# Altium integrated library Samtec_2,54_mm_Pitch_Socket_Strips.IntLib: 489 symbols (part 2 of 4) (continued)
## SSM-108-L-DV-BE-K
designator J?
Tiger Claw(TM) Surface Mount Socket, Vertical, -55 to 125 degC, 2.54 mm Pitch, 16-Pin, Female, RoHS; Manufacturer: Samtec; PartNumber: SSM-108-L-DV-BE-K; Pitch: 2.54 mm; DatasheetVersion: F-214; PackageVersion: AK, 3/2000; PackageReference: SSM-108-X-DV-BE-K; PackageDescription: .100 C.L. Double Vertical SMT Socket Strip; Orientation: Vertical; RoHS: True; Temperature Range: -55 to 125 degC; Mounting Technology: Surface Mount; ComponentLink1Description: Manufacturer URL; ComponentLink1URL: http://www.samtec.com; ComponentLink2Description: Datasheet; ComponentLink2URL: http://www.samtec.com/documents/webfiles/pdf/SSM_SM.PDF; ComponentLink3Description: Package Specification; ComponentLink3URL: http://www.samtec.com/documents/webfiles/cpdf/SSM-1XX-XXX-DV-XX-XX-X-XX-MKT.pdf
footprint SMTC-SSM-108-X-DV-BE-K (C.L. Double Vertical SMT Socket Strip, 2x8 Pins, 2.54mm Pitch, Female)
pins: 1, 2, 3, 4, 5, 6, 7, 8, 9, 10, 11, 12, 13, 14, 15, 16

## SSM-108-S-DV
designator J?
Tiger Claw(TM) Surface Mount Socket, Vertical, -55 to 125 degC, 2.54 mm Pitch, 16-Pin, Female, RoHS; Manufacturer: Samtec; PartNumber: SSM-108-S-DV; Pitch: 2.54 mm; DatasheetVersion: F-214; PackageVersion: AK, 3/2000; PackageReference: SSM-108-X-DV; PackageDescription: .100 C.L. Double Vertical SMT Socket Strip; Supplier 1: Digi-Key; Supplier Part Number 1: SAM1150-08-ND; Supplier 2: Newark; Supplier Part Number 2: 11P7893; Orientation: Vertical; RoHS: True; Temperature Range: -55 to 125 degC; Mounting Technology: Surface Mount; ComponentLink1Description: Manufacturer URL; ComponentLink1URL: http://www.samtec.com; ComponentLink2Description: Datasheet; ComponentLink2URL: http://www.samtec.com/documents/webfiles/pdf/SSM_SM.PDF; ComponentLink3Description: Package Specification; ComponentLink3URL: http://www.samtec.com/documents/webfiles/cpdf/SSM-1XX-XXX-DV-XX-XX-X-XX-MKT.pdf
footprint SMTC-SSM-108-X-DV (C.L. Double Vertical SMT Socket Strip, 2x8 Pins, 2.54mm Pitch, Female)
pins: 1, 2, 3, 4, 5, 6, 7, 8, 9, 10, 11, 12, 13, 14, 15, 16

## SSM-108-S-DV-A
designator J?
Tiger Claw(TM) Surface Mount Socket, Vertical, -55 to 125 degC, 2.54 mm Pitch, 16-Pin, Female, RoHS; Manufacturer: Samtec; PartNumber: SSM-108-S-DV-A; Pitch: 2.54 mm; DatasheetVersion: F-214; PackageVersion: AK, 3/2000; PackageReference: SSM-108-X-DV-A; PackageDescription: .100 C.L. Double Vertical SMT Socket Strip; Supplier 1: Newark; Supplier Part Number 1: 81P4509; Orientation: Vertical; RoHS: True; Temperature Range: -55 to 125 degC; Mounting Technology: Surface Mount; ComponentLink1Description: Manufacturer URL; ComponentLink1URL: http://www.samtec.com; ComponentLink2Description: Datasheet; ComponentLink2URL: http://www.samtec.com/documents/webfiles/pdf/SSM_SM.PDF; ComponentLink3Description: Package Specification; ComponentLink3URL: http://www.samtec.com/documents/webfiles/cpdf/SSM-1XX-XXX-DV-XX-XX-X-XX-MKT.pdf
footprint SMTC-SSM-108-X-DV-A (C.L. Double Vertical SMT Socket Strip, 2x8 Pins, 2.54mm Pitch, Female)
pins: 1, 2, 3, 4, 5, 6, 7, 8, 9, 10, 11, 12, 13, 14, 15, 16

## SSM-108-S-DV-BE-K
designator J?
Tiger Claw(TM) Surface Mount Socket, Vertical, -55 to 125 degC, 2.54 mm Pitch, 16-Pin, Female, RoHS; Manufacturer: Samtec; PartNumber: SSM-108-S-DV-BE-K; Pitch: 2.54 mm; DatasheetVersion: F-214; PackageVersion: AK, 3/2000; PackageReference: SSM-108-X-DV-BE-K; PackageDescription: .100 C.L. Double Vertical SMT Socket Strip; Orientation: Vertical; RoHS: True; Temperature Range: -55 to 125 degC; Mounting Technology: Surface Mount; ComponentLink1Description: Manufacturer URL; ComponentLink1URL: http://www.samtec.com; ComponentLink2Description: Datasheet; ComponentLink2URL: http://www.samtec.com/documents/webfiles/pdf/SSM_SM.PDF; ComponentLink3Description: Package Specification; ComponentLink3URL: http://www.samtec.com/documents/webfiles/cpdf/SSM-1XX-XXX-DV-XX-XX-X-XX-MKT.pdf
footprint SMTC-SSM-108-X-DV-BE-K (C.L. Double Vertical SMT Socket Strip, 2x8 Pins, 2.54mm Pitch, Female)
pins: 1, 2, 3, 4, 5, 6, 7, 8, 9, 10, 11, 12, 13, 14, 15, 16

## SSM-109-F-DV-A
designator J?
Tiger Claw(TM) Surface Mount Socket, Vertical, -55 to 125 degC, 2.54 mm Pitch, 18-Pin, Female, RoHS; Manufacturer: Samtec; PartNumber: SSM-109-F-DV-A; Pitch: 2.54 mm; DatasheetVersion: F-214; PackageVersion: AK, 3/2000; PackageReference: SSM-109-X-DV-A; PackageDescription: .100 C.L. Double Vertical SMT Socket Strip; Orientation: Vertical; RoHS: True; Temperature Range: -55 to 125 degC; Mounting Technology: Surface Mount; ComponentLink1Description: Manufacturer URL; ComponentLink1URL: http://www.samtec.com; ComponentLink2Description: Datasheet; ComponentLink2URL: http://www.samtec.com/documents/webfiles/pdf/SSM_SM.PDF; ComponentLink3Description: Package Specification; ComponentLink3URL: http://www.samtec.com/documents/webfiles/cpdf/SSM-1XX-XXX-DV-XX-XX-X-XX-MKT.pdf
footprint SMTC-SSM-109-X-DV-A (C.L. Double Vertical SMT Socket Strip, 2x9 Pins, 2.54mm Pitch, Female)
pins: 1, 2, 3, 4, 5, 6, 7, 8, 9, 10, 11, 12, 13, 14, 15, 16, 17, 18

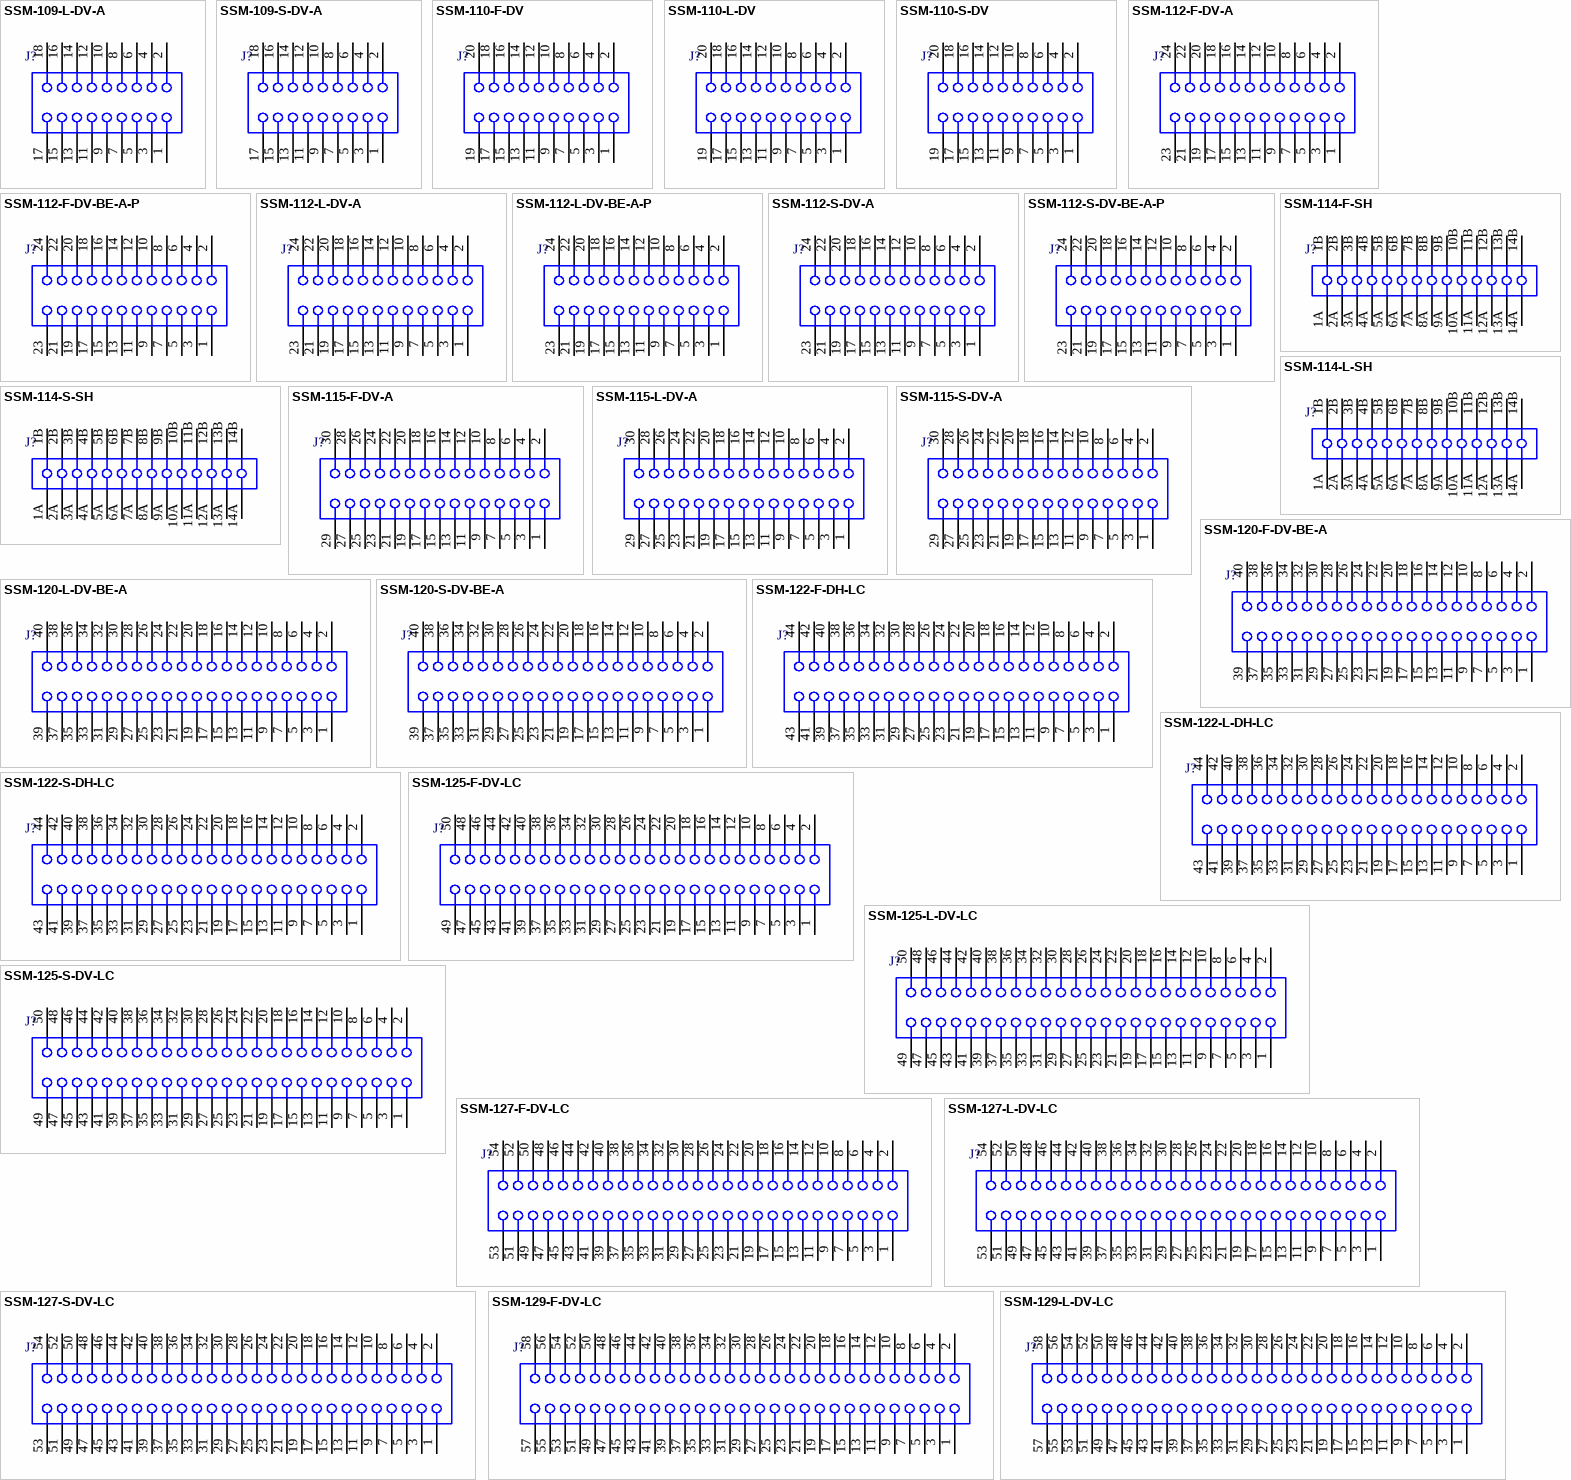
[diagram p6: symbols SSM-109-L-DV-A to SSM-129-L-DV-LC]

## SSM-109-L-DV-A
designator J?
Tiger Claw(TM) Surface Mount Socket, Vertical, -55 to 125 degC, 2.54 mm Pitch, 18-Pin, Female, RoHS; Manufacturer: Samtec; PartNumber: SSM-109-L-DV-A; Pitch: 2.54 mm; DatasheetVersion: F-214; PackageVersion: AK, 3/2000; PackageReference: SSM-109-X-DV-A; PackageDescription: .100 C.L. Double Vertical SMT Socket Strip; Orientation: Vertical; RoHS: True; Temperature Range: -55 to 125 degC; Mounting Technology: Surface Mount; ComponentLink1Description: Manufacturer URL; ComponentLink1URL: http://www.samtec.com; ComponentLink2Description: Datasheet; ComponentLink2URL: http://www.samtec.com/documents/webfiles/pdf/SSM_SM.PDF; ComponentLink3Description: Package Specification; ComponentLink3URL: http://www.samtec.com/documents/webfiles/cpdf/SSM-1XX-XXX-DV-XX-XX-X-XX-MKT.pdf
footprint SMTC-SSM-109-X-DV-A (C.L. Double Vertical SMT Socket Strip, 2x9 Pins, 2.54mm Pitch, Female)
pins: 1, 2, 3, 4, 5, 6, 7, 8, 9, 10, 11, 12, 13, 14, 15, 16, 17, 18

## SSM-109-S-DV-A
designator J?
Tiger Claw(TM) Surface Mount Socket, Vertical, -55 to 125 degC, 2.54 mm Pitch, 18-Pin, Female, RoHS; Manufacturer: Samtec; PartNumber: SSM-109-S-DV-A; Pitch: 2.54 mm; DatasheetVersion: F-214; PackageVersion: AK, 3/2000; PackageReference: SSM-109-X-DV-A; PackageDescription: .100 C.L. Double Vertical SMT Socket Strip; Orientation: Vertical; RoHS: True; Temperature Range: -55 to 125 degC; Mounting Technology: Surface Mount; ComponentLink1Description: Manufacturer URL; ComponentLink1URL: http://www.samtec.com; ComponentLink2Description: Datasheet; ComponentLink2URL: http://www.samtec.com/documents/webfiles/pdf/SSM_SM.PDF; ComponentLink3Description: Package Specification; ComponentLink3URL: http://www.samtec.com/documents/webfiles/cpdf/SSM-1XX-XXX-DV-XX-XX-X-XX-MKT.pdf
footprint SMTC-SSM-109-X-DV-A (C.L. Double Vertical SMT Socket Strip, 2x9 Pins, 2.54mm Pitch, Female)
pins: 1, 2, 3, 4, 5, 6, 7, 8, 9, 10, 11, 12, 13, 14, 15, 16, 17, 18

## SSM-110-F-DV
designator J?
Tiger Claw(TM) Surface Mount Socket, Vertical, -55 to 125 degC, 2.54 mm Pitch, 20-Pin, Female, RoHS; Manufacturer: Samtec; PartNumber: SSM-110-F-DV; Pitch: 2.54 mm; DatasheetVersion: F-214; PackageVersion: AK, 3/2000; PackageReference: SSM-110-X-DV; PackageDescription: .100 C.L. Double Vertical SMT Socket Strip; Orientation: Vertical; RoHS: True; Temperature Range: -55 to 125 degC; Mounting Technology: Surface Mount; ComponentLink1Description: Manufacturer URL; ComponentLink1URL: http://www.samtec.com; ComponentLink2Description: Datasheet; ComponentLink2URL: http://www.samtec.com/documents/webfiles/pdf/SSM_SM.PDF; ComponentLink3Description: Package Specification; ComponentLink3URL: http://www.samtec.com/documents/webfiles/cpdf/SSM-1XX-XXX-DV-XX-XX-X-XX-MKT.pdf
footprint SMTC-SSM-110-X-DV (C.L. Double Vertical SMT Socket Strip, 2x10 Pins, 2.54mm Pitch, Female)
pins: 1, 2, 3, 4, 5, 6, 7, 8, 9, 10, 11, 12, 13, 14, 15, 16, 17, 18, 19, 20

## SSM-110-L-DV
designator J?
Tiger Claw(TM) Surface Mount Socket, Vertical, -55 to 125 degC, 2.54 mm Pitch, 20-Pin, Female, RoHS; Manufacturer: Samtec; PartNumber: SSM-110-L-DV; Pitch: 2.54 mm; DatasheetVersion: F-214; PackageVersion: AK, 3/2000; PackageReference: SSM-110-X-DV; PackageDescription: .100 C.L. Double Vertical SMT Socket Strip; Supplier 1: Digi-Key; Supplier Part Number 1: SAM1146-10-ND; Supplier 2: Farnell; Supplier Part Number 2: 1668261; Supplier 3: Newark; Supplier Part Number 3: 11P7905; Orientation: Vertical; RoHS: True; Temperature Range: -55 to 125 degC; Mounting Technology: Surface Mount; ComponentLink1Description: Manufacturer URL; ComponentLink1URL: http://www.samtec.com; ComponentLink2Description: Datasheet; ComponentLink2URL: http://www.samtec.com/documents/webfiles/pdf/SSM_SM.PDF; ComponentLink3Description: Package Specification; ComponentLink3URL: http://www.samtec.com/documents/webfiles/cpdf/SSM-1XX-XXX-DV-XX-XX-X-XX-MKT.pdf
footprint SMTC-SSM-110-X-DV (C.L. Double Vertical SMT Socket Strip, 2x10 Pins, 2.54mm Pitch, Female)
pins: 1, 2, 3, 4, 5, 6, 7, 8, 9, 10, 11, 12, 13, 14, 15, 16, 17, 18, 19, 20

## SSM-110-S-DV
designator J?
Tiger Claw(TM) Surface Mount Socket, Vertical, -55 to 125 degC, 2.54 mm Pitch, 20-Pin, Female, RoHS; Manufacturer: Samtec; PartNumber: SSM-110-S-DV; Pitch: 2.54 mm; DatasheetVersion: F-214; PackageVersion: AK, 3/2000; PackageReference: SSM-110-X-DV; PackageDescription: .100 C.L. Double Vertical SMT Socket Strip; Supplier 1: Digi-Key; Supplier Part Number 1: SAM1150-10-ND; Supplier 2: Newark; Supplier Part Number 2: 66H7361; Orientation: Vertical; RoHS: True; Temperature Range: -55 to 125 degC; Mounting Technology: Surface Mount; ComponentLink1Description: Manufacturer URL; ComponentLink1URL: http://www.samtec.com; ComponentLink2Description: Datasheet; ComponentLink2URL: http://www.samtec.com/documents/webfiles/pdf/SSM_SM.PDF; ComponentLink3Description: Package Specification; ComponentLink3URL: http://www.samtec.com/documents/webfiles/cpdf/SSM-1XX-XXX-DV-XX-XX-X-XX-MKT.pdf
footprint SMTC-SSM-110-X-DV (C.L. Double Vertical SMT Socket Strip, 2x10 Pins, 2.54mm Pitch, Female)
pins: 1, 2, 3, 4, 5, 6, 7, 8, 9, 10, 11, 12, 13, 14, 15, 16, 17, 18, 19, 20

## SSM-112-F-DV-A
designator J?
Tiger Claw(TM) Surface Mount Socket, Vertical, -55 to 125 degC, 2.54 mm Pitch, 24-Pin, Female, RoHS; Manufacturer: Samtec; PartNumber: SSM-112-F-DV-A; Pitch: 2.54 mm; DatasheetVersion: F-214; PackageVersion: AK, 3/2000; PackageReference: SSM-112-X-DV-A; PackageDescription: .100 C.L. Double Vertical SMT Socket Strip; Orientation: Vertical; RoHS: True; Temperature Range: -55 to 125 degC; Mounting Technology: Surface Mount; ComponentLink1Description: Manufacturer URL; ComponentLink1URL: http://www.samtec.com; ComponentLink2Description: Datasheet; ComponentLink2URL: http://www.samtec.com/documents/webfiles/pdf/SSM_SM.PDF; ComponentLink3Description: Package Specification; ComponentLink3URL: http://www.samtec.com/documents/webfiles/cpdf/SSM-1XX-XXX-DV-XX-XX-X-XX-MKT.pdf
footprint SMTC-SSM-112-X-DV-A (C.L. Double Vertical SMT Socket Strip, 2x12 Pins, 2.54mm Pitch, Female)
pins: 1, 2, 3, 4, 5, 6, 7, 8, 9, 10, 11, 12, 13, 14, 15, 16, 17, 18, 19, 20, 21, 22, 23, 24

## SSM-112-F-DV-BE-A-P
designator J?
Tiger Claw(TM) Surface Mount Socket, Vertical, -55 to 125 degC, 2.54 mm Pitch, 24-Pin, Female, RoHS; Manufacturer: Samtec; PartNumber: SSM-112-F-DV-BE-A-P; Pitch: 2.54 mm; DatasheetVersion: F-214; PackageVersion: AK, 3/2000; PackageReference: SSM-112-X-DV-BE-A-P; PackageDescription: .100 C.L. Double Vertical SMT Socket Strip; Orientation: Vertical; RoHS: True; Temperature Range: -55 to 125 degC; Mounting Technology: Surface Mount; ComponentLink1Description: Manufacturer URL; ComponentLink1URL: http://www.samtec.com; ComponentLink2Description: Datasheet; ComponentLink2URL: http://www.samtec.com/documents/webfiles/pdf/SSM_SM.PDF; ComponentLink3Description: Package Specification; ComponentLink3URL: http://www.samtec.com/documents/webfiles/cpdf/SSM-1XX-XXX-DV-XX-XX-X-XX-MKT.pdf
footprint SMTC-SSM-112-X-DV-BE-A-P (C.L. Double Vertical SMT Socket Strip, 2x12 Pins, 2.54mm Pitch, Female)
pins: 1, 2, 3, 4, 5, 6, 7, 8, 9, 10, 11, 12, 13, 14, 15, 16, 17, 18, 19, 20, 21, 22, 23, 24

## SSM-112-L-DV-A
designator J?
Tiger Claw(TM) Surface Mount Socket, Vertical, -55 to 125 degC, 2.54 mm Pitch, 24-Pin, Female, RoHS; Manufacturer: Samtec; PartNumber: SSM-112-L-DV-A; Pitch: 2.54 mm; DatasheetVersion: F-214; PackageVersion: AK, 3/2000; PackageReference: SSM-112-X-DV-A; PackageDescription: .100 C.L. Double Vertical SMT Socket Strip; Orientation: Vertical; RoHS: True; Temperature Range: -55 to 125 degC; Mounting Technology: Surface Mount; ComponentLink1Description: Manufacturer URL; ComponentLink1URL: http://www.samtec.com; ComponentLink2Description: Datasheet; ComponentLink2URL: http://www.samtec.com/documents/webfiles/pdf/SSM_SM.PDF; ComponentLink3Description: Package Specification; ComponentLink3URL: http://www.samtec.com/documents/webfiles/cpdf/SSM-1XX-XXX-DV-XX-XX-X-XX-MKT.pdf
footprint SMTC-SSM-112-X-DV-A (C.L. Double Vertical SMT Socket Strip, 2x12 Pins, 2.54mm Pitch, Female)
pins: 1, 2, 3, 4, 5, 6, 7, 8, 9, 10, 11, 12, 13, 14, 15, 16, 17, 18, 19, 20, 21, 22, 23, 24

## SSM-112-L-DV-BE-A-P
designator J?
Tiger Claw(TM) Surface Mount Socket, Vertical, -55 to 125 degC, 2.54 mm Pitch, 24-Pin, Female, RoHS; Manufacturer: Samtec; PartNumber: SSM-112-L-DV-BE-A-P; Pitch: 2.54 mm; DatasheetVersion: F-214; PackageVersion: AK, 3/2000; PackageReference: SSM-112-X-DV-BE-A-P; PackageDescription: .100 C.L. Double Vertical SMT Socket Strip; Orientation: Vertical; RoHS: True; Temperature Range: -55 to 125 degC; Mounting Technology: Surface Mount; ComponentLink1Description: Manufacturer URL; ComponentLink1URL: http://www.samtec.com; ComponentLink2Description: Datasheet; ComponentLink2URL: http://www.samtec.com/documents/webfiles/pdf/SSM_SM.PDF; ComponentLink3Description: Package Specification; ComponentLink3URL: http://www.samtec.com/documents/webfiles/cpdf/SSM-1XX-XXX-DV-XX-XX-X-XX-MKT.pdf
footprint SMTC-SSM-112-X-DV-BE-A-P (C.L. Double Vertical SMT Socket Strip, 2x12 Pins, 2.54mm Pitch, Female)
pins: 1, 2, 3, 4, 5, 6, 7, 8, 9, 10, 11, 12, 13, 14, 15, 16, 17, 18, 19, 20, 21, 22, 23, 24

## SSM-112-S-DV-A
designator J?
Tiger Claw(TM) Surface Mount Socket, Vertical, -55 to 125 degC, 2.54 mm Pitch, 24-Pin, Female, RoHS; Manufacturer: Samtec; PartNumber: SSM-112-S-DV-A; Pitch: 2.54 mm; DatasheetVersion: F-214; PackageVersion: AK, 3/2000; PackageReference: SSM-112-X-DV-A; PackageDescription: .100 C.L. Double Vertical SMT Socket Strip; Orientation: Vertical; RoHS: True; Temperature Range: -55 to 125 degC; Mounting Technology: Surface Mount; ComponentLink1Description: Manufacturer URL; ComponentLink1URL: http://www.samtec.com; ComponentLink2Description: Datasheet; ComponentLink2URL: http://www.samtec.com/documents/webfiles/pdf/SSM_SM.PDF; ComponentLink3Description: Package Specification; ComponentLink3URL: http://www.samtec.com/documents/webfiles/cpdf/SSM-1XX-XXX-DV-XX-XX-X-XX-MKT.pdf
footprint SMTC-SSM-112-X-DV-A (C.L. Double Vertical SMT Socket Strip, 2x12 Pins, 2.54mm Pitch, Female)
pins: 1, 2, 3, 4, 5, 6, 7, 8, 9, 10, 11, 12, 13, 14, 15, 16, 17, 18, 19, 20, 21, 22, 23, 24

## SSM-112-S-DV-BE-A-P
designator J?
Tiger Claw(TM) Surface Mount Socket, Vertical, -55 to 125 degC, 2.54 mm Pitch, 24-Pin, Female, RoHS; Manufacturer: Samtec; PartNumber: SSM-112-S-DV-BE-A-P; Pitch: 2.54 mm; DatasheetVersion: F-214; PackageVersion: AK, 3/2000; PackageReference: SSM-112-X-DV-BE-A-P; PackageDescription: .100 C.L. Double Vertical SMT Socket Strip; Orientation: Vertical; RoHS: True; Temperature Range: -55 to 125 degC; Mounting Technology: Surface Mount; ComponentLink1Description: Manufacturer URL; ComponentLink1URL: http://www.samtec.com; ComponentLink2Description: Datasheet; ComponentLink2URL: http://www.samtec.com/documents/webfiles/pdf/SSM_SM.PDF; ComponentLink3Description: Package Specification; ComponentLink3URL: http://www.samtec.com/documents/webfiles/cpdf/SSM-1XX-XXX-DV-XX-XX-X-XX-MKT.pdf
footprint SMTC-SSM-112-X-DV-BE-A-P (C.L. Double Vertical SMT Socket Strip, 2x12 Pins, 2.54mm Pitch, Female)
pins: 1, 2, 3, 4, 5, 6, 7, 8, 9, 10, 11, 12, 13, 14, 15, 16, 17, 18, 19, 20, 21, 22, 23, 24

## SSM-114-F-SH
designator J?
Tiger Claw(TM) Surface Mount Socket, Horizontal, -55 to 125 degC, 2.54 mm Pitch, 28-Pin, Female, RoHS; Manufacturer: Samtec; PartNumber: SSM-114-F-SH; Pitch: 2.54 mm; DatasheetVersion: F-214; PackageVersion: CR, 9/1998; PackageReference: SSM-114-X-SH; PackageDescription: .100 C.L. Surface Mount Socket Strip; Orientation: Horizontal; RoHS: True; Temperature Range: -55 to 125 degC; Mounting Technology: Surface Mount; ComponentLink1Description: Manufacturer URL; ComponentLink1URL: http://www.samtec.com; ComponentLink2Description: Datasheet; ComponentLink2URL: http://www.samtec.com/documents/webfiles/pdf/SSM_SM.PDF; ComponentLink3Description: Package Specification; ComponentLink3URL: http://www.samtec.com/documents/webfiles/cpdf/SSM-1XX-XXX-XX-XX-XX-X-XX-XX-MKT.pdf
footprint SMTC-SSM-114-X-SH (C.L. Surface Mount Socket Strip, 2x14 Pins, Horizontal, 2.54 mm Pitch, Female)
pins: 1A, 1B, 2A, 2B, 3A, 3B, 4A, 4B, 5A, 5B, 6A, 6B, 7A, 7B, 8A, 8B, 9A, 9B, 10A, 10B, 11A, 11B, 12A, 12B, 13A, 13B, 14A, 14B

## SSM-114-L-SH
designator J?
Tiger Claw(TM) Surface Mount Socket, Horizontal, -55 to 125 degC, 2.54 mm Pitch, 28-Pin, Female, RoHS; Manufacturer: Samtec; PartNumber: SSM-114-L-SH; Pitch: 2.54 mm; DatasheetVersion: F-214; PackageVersion: CR, 9/1998; PackageReference: SSM-114-X-SH; PackageDescription: .100 C.L. Surface Mount Socket Strip; Supplier 1: Digi-Key; Supplier Part Number 1: SAM1147-14-ND; Supplier 2: Farnell; Supplier Part Number 2: 1668267; Supplier 3: Newark; Supplier Part Number 3: 11P7936; Orientation: Horizontal; RoHS: True; Temperature Range: -55 to 125 degC; Mounting Technology: Surface Mount; ComponentLink1Description: Manufacturer URL; ComponentLink1URL: http://www.samtec.com; ComponentLink2Description: Datasheet; ComponentLink2URL: http://www.samtec.com/documents/webfiles/pdf/SSM_SM.PDF; ComponentLink3Description: Package Specification; ComponentLink3URL: http://www.samtec.com/documents/webfiles/cpdf/SSM-1XX-XXX-XX-XX-XX-X-XX-XX-MKT.pdf
footprint SMTC-SSM-114-X-SH (C.L. Surface Mount Socket Strip, 2x14 Pins, Horizontal, 2.54 mm Pitch, Female)
pins: 1A, 1B, 2A, 2B, 3A, 3B, 4A, 4B, 5A, 5B, 6A, 6B, 7A, 7B, 8A, 8B, 9A, 9B, 10A, 10B, 11A, 11B, 12A, 12B, 13A, 13B, 14A, 14B

## SSM-114-S-SH
designator J?
Tiger Claw(TM) Surface Mount Socket, Horizontal, -55 to 125 degC, 2.54 mm Pitch, 28-Pin, Female, RoHS; Manufacturer: Samtec; PartNumber: SSM-114-S-SH; Pitch: 2.54 mm; DatasheetVersion: F-214; PackageVersion: CR, 9/1998; PackageReference: SSM-114-X-SH; PackageDescription: .100 C.L. Surface Mount Socket Strip; Supplier 1: Digi-Key; Supplier Part Number 1: SAM1151-14-ND; Supplier 2: Newark; Supplier Part Number 2: 11P7940; Orientation: Horizontal; RoHS: True; Temperature Range: -55 to 125 degC; Mounting Technology: Surface Mount; ComponentLink1Description: Manufacturer URL; ComponentLink1URL: http://www.samtec.com; ComponentLink2Description: Datasheet; ComponentLink2URL: http://www.samtec.com/documents/webfiles/pdf/SSM_SM.PDF; ComponentLink3Description: Package Specification; ComponentLink3URL: http://www.samtec.com/documents/webfiles/cpdf/SSM-1XX-XXX-XX-XX-XX-X-XX-XX-MKT.pdf
footprint SMTC-SSM-114-X-SH (C.L. Surface Mount Socket Strip, 2x14 Pins, Horizontal, 2.54 mm Pitch, Female)
pins: 1A, 1B, 2A, 2B, 3A, 3B, 4A, 4B, 5A, 5B, 6A, 6B, 7A, 7B, 8A, 8B, 9A, 9B, 10A, 10B, 11A, 11B, 12A, 12B, 13A, 13B, 14A, 14B

## SSM-115-F-DV-A
designator J?
Tiger Claw(TM) Surface Mount Socket, Vertical, -55 to 125 degC, 2.54 mm Pitch, 30-Pin, Female, RoHS; Manufacturer: Samtec; PartNumber: SSM-115-F-DV-A; Pitch: 2.54 mm; DatasheetVersion: F-214; PackageVersion: AK, 3/2000; PackageReference: SSM-115-X-DV-A; PackageDescription: .100 C.L. Double Vertical SMT Socket Strip; Orientation: Vertical; RoHS: True; Temperature Range: -55 to 125 degC; Mounting Technology: Surface Mount; ComponentLink1Description: Manufacturer URL; ComponentLink1URL: http://www.samtec.com; ComponentLink2Description: Datasheet; ComponentLink2URL: http://www.samtec.com/documents/webfiles/pdf/SSM_SM.PDF; ComponentLink3Description: Package Specification; ComponentLink3URL: http://www.samtec.com/documents/webfiles/cpdf/SSM-1XX-XXX-DV-XX-XX-X-XX-MKT.pdf
footprint SMTC-SSM-115-X-DV-A (C.L. Double Vertical SMT Socket Strip, 2x15 Pins, 2.54mm Pitch, Female)
pins: 1, 2, 3, 4, 5, 6, 7, 8, 9, 10, 11, 12, 13, 14, 15, 16, 17, 18, 19, 20, 21, 22, 23, 24, 25, 26, 27, 28, 29, 30

## SSM-115-L-DV-A
designator J?
Tiger Claw(TM) Surface Mount Socket, Vertical, -55 to 125 degC, 2.54 mm Pitch, 30-Pin, Female, RoHS; Manufacturer: Samtec; PartNumber: SSM-115-L-DV-A; Pitch: 2.54 mm; DatasheetVersion: F-214; PackageVersion: AK, 3/2000; PackageReference: SSM-115-X-DV-A; PackageDescription: .100 C.L. Double Vertical SMT Socket Strip; Orientation: Vertical; RoHS: True; Temperature Range: -55 to 125 degC; Mounting Technology: Surface Mount; ComponentLink1Description: Manufacturer URL; ComponentLink1URL: http://www.samtec.com; ComponentLink2Description: Datasheet; ComponentLink2URL: http://www.samtec.com/documents/webfiles/pdf/SSM_SM.PDF; ComponentLink3Description: Package Specification; ComponentLink3URL: http://www.samtec.com/documents/webfiles/cpdf/SSM-1XX-XXX-DV-XX-XX-X-XX-MKT.pdf
footprint SMTC-SSM-115-X-DV-A (C.L. Double Vertical SMT Socket Strip, 2x15 Pins, 2.54mm Pitch, Female)
pins: 1, 2, 3, 4, 5, 6, 7, 8, 9, 10, 11, 12, 13, 14, 15, 16, 17, 18, 19, 20, 21, 22, 23, 24, 25, 26, 27, 28, 29, 30

## SSM-115-S-DV-A
designator J?
Tiger Claw(TM) Surface Mount Socket, Vertical, -55 to 125 degC, 2.54 mm Pitch, 30-Pin, Female, RoHS; Manufacturer: Samtec; PartNumber: SSM-115-S-DV-A; Pitch: 2.54 mm; DatasheetVersion: F-214; PackageVersion: AK, 3/2000; PackageReference: SSM-115-X-DV-A; PackageDescription: .100 C.L. Double Vertical SMT Socket Strip; Orientation: Vertical; RoHS: True; Temperature Range: -55 to 125 degC; Mounting Technology: Surface Mount; ComponentLink1Description: Manufacturer URL; ComponentLink1URL: http://www.samtec.com; ComponentLink2Description: Datasheet; ComponentLink2URL: http://www.samtec.com/documents/webfiles/pdf/SSM_SM.PDF; ComponentLink3Description: Package Specification; ComponentLink3URL: http://www.samtec.com/documents/webfiles/cpdf/SSM-1XX-XXX-DV-XX-XX-X-XX-MKT.pdf
footprint SMTC-SSM-115-X-DV-A (C.L. Double Vertical SMT Socket Strip, 2x15 Pins, 2.54mm Pitch, Female)
pins: 1, 2, 3, 4, 5, 6, 7, 8, 9, 10, 11, 12, 13, 14, 15, 16, 17, 18, 19, 20, 21, 22, 23, 24, 25, 26, 27, 28, 29, 30

## SSM-120-F-DV-BE-A
designator J?
Tiger Claw(TM) Surface Mount Socket, Vertical, -55 to 125 degC, 2.54 mm Pitch, 40-Pin, Female, RoHS; Manufacturer: Samtec; PartNumber: SSM-120-F-DV-BE-A; Pitch: 2.54 mm; DatasheetVersion: F-214; PackageVersion: AK, 3/2000; PackageReference: SSM-120-X-DV-BE-A; PackageDescription: .100 C.L. Double Vertical SMT Socket Strip; Orientation: Vertical; RoHS: True; Temperature Range: -55 to 125 degC; Mounting Technology: Surface Mount; ComponentLink1Description: Manufacturer URL; ComponentLink1URL: http://www.samtec.com; ComponentLink2Description: Datasheet; ComponentLink2URL: http://www.samtec.com/documents/webfiles/pdf/SSM_SM.PDF; ComponentLink3Description: Package Specification; ComponentLink3URL: http://www.samtec.com/documents/webfiles/cpdf/SSM-1XX-XXX-DV-XX-XX-X-XX-MKT.pdf
footprint SMTC-SSM-120-X-DV-BE-A (C.L. Double Vertical SMT Socket Strip, 2x20 Pins, 2.54mm Pitch, Female)
pins: 1, 2, 3, 4, 5, 6, 7, 8, 9, 10, 11, 12, 13, 14, 15, 16, 17, 18, 19, 20, 21, 22, 23, 24, 25, 26, 27, 28, 29, 30, 31, 32, 33, 34, 35, 36, 37, 38, 39, 40

## SSM-120-L-DV-BE-A
designator J?
Tiger Claw(TM) Surface Mount Socket, Vertical, -55 to 125 degC, 2.54 mm Pitch, 40-Pin, Female, RoHS; Manufacturer: Samtec; PartNumber: SSM-120-L-DV-BE-A; Pitch: 2.54 mm; DatasheetVersion: F-214; PackageVersion: AK, 3/2000; PackageReference: SSM-120-X-DV-BE-A; PackageDescription: .100 C.L. Double Vertical SMT Socket Strip; Orientation: Vertical; RoHS: True; Temperature Range: -55 to 125 degC; Mounting Technology: Surface Mount; ComponentLink1Description: Manufacturer URL; ComponentLink1URL: http://www.samtec.com; ComponentLink2Description: Datasheet; ComponentLink2URL: http://www.samtec.com/documents/webfiles/pdf/SSM_SM.PDF; ComponentLink3Description: Package Specification; ComponentLink3URL: http://www.samtec.com/documents/webfiles/cpdf/SSM-1XX-XXX-DV-XX-XX-X-XX-MKT.pdf
footprint SMTC-SSM-120-X-DV-BE-A (C.L. Double Vertical SMT Socket Strip, 2x20 Pins, 2.54mm Pitch, Female)
pins: 1, 2, 3, 4, 5, 6, 7, 8, 9, 10, 11, 12, 13, 14, 15, 16, 17, 18, 19, 20, 21, 22, 23, 24, 25, 26, 27, 28, 29, 30, 31, 32, 33, 34, 35, 36, 37, 38, 39, 40

## SSM-120-S-DV-BE-A
designator J?
Tiger Claw(TM) Surface Mount Socket, Vertical, -55 to 125 degC, 2.54 mm Pitch, 40-Pin, Female, RoHS; Manufacturer: Samtec; PartNumber: SSM-120-S-DV-BE-A; Pitch: 2.54 mm; DatasheetVersion: F-214; PackageVersion: AK, 3/2000; PackageReference: SSM-120-X-DV-BE-A; PackageDescription: .100 C.L. Double Vertical SMT Socket Strip; Orientation: Vertical; RoHS: True; Temperature Range: -55 to 125 degC; Mounting Technology: Surface Mount; ComponentLink1Description: Manufacturer URL; ComponentLink1URL: http://www.samtec.com; ComponentLink2Description: Datasheet; ComponentLink2URL: http://www.samtec.com/documents/webfiles/pdf/SSM_SM.PDF; ComponentLink3Description: Package Specification; ComponentLink3URL: http://www.samtec.com/documents/webfiles/cpdf/SSM-1XX-XXX-DV-XX-XX-X-XX-MKT.pdf
footprint SMTC-SSM-120-X-DV-BE-A (C.L. Double Vertical SMT Socket Strip, 2x20 Pins, 2.54mm Pitch, Female)
pins: 1, 2, 3, 4, 5, 6, 7, 8, 9, 10, 11, 12, 13, 14, 15, 16, 17, 18, 19, 20, 21, 22, 23, 24, 25, 26, 27, 28, 29, 30, 31, 32, 33, 34, 35, 36, 37, 38, 39, 40

## SSM-122-F-DH-LC
designator J?
Tiger Claw(TM) Surface Mount Socket, Horizontal, -55 to 125 degC, 2.54 mm Pitch, 44-Pin, Female, RoHS; Manufacturer: Samtec; PartNumber: SSM-122-F-DH-LC; Pitch: 2.54 mm; DatasheetVersion: F-214; PackageVersion: CR, 9/1998; PackageReference: SSM-122-X-DH-LC; PackageDescription: .100 C.L. Surface Mount Socket Strip; Orientation: Horizontal; RoHS: True; Temperature Range: -55 to 125 degC; Mounting Technology: Surface Mount; ComponentLink1Description: Manufacturer URL; ComponentLink1URL: http://www.samtec.com; ComponentLink2Description: Datasheet; ComponentLink2URL: http://www.samtec.com/documents/webfiles/pdf/SSM_SM.PDF; ComponentLink3Description: Package Specification; ComponentLink3URL: http://www.samtec.com/documents/webfiles/cpdf/SSM-1XX-XXX-XX-XX-XX-X-XX-XX-MKT.pdf
footprint SMTC-SSM-122-X-DH-LC (C.L. Surface Mount Socket Strip, 2x22 Pins, Horizontal, 2.54 mm Pitch, Female)
pins: 1, 2, 3, 4, 5, 6, 7, 8, 9, 10, 11, 12, 13, 14, 15, 16, 17, 18, 19, 20, 21, 22, 23, 24, 25, 26, 27, 28, 29, 30, 31, 32, 33, 34, 35, 36, 37, 38, 39, 40, 41, 42, 43, 44

## SSM-122-L-DH-LC
designator J?
Tiger Claw(TM) Surface Mount Socket, Horizontal, -55 to 125 degC, 2.54 mm Pitch, 44-Pin, Female, RoHS; Manufacturer: Samtec; PartNumber: SSM-122-L-DH-LC; Pitch: 2.54 mm; DatasheetVersion: F-214; PackageVersion: CR, 9/1998; PackageReference: SSM-122-X-DH-LC; PackageDescription: .100 C.L. Surface Mount Socket Strip; Orientation: Horizontal; RoHS: True; Temperature Range: -55 to 125 degC; Mounting Technology: Surface Mount; ComponentLink1Description: Manufacturer URL; ComponentLink1URL: http://www.samtec.com; ComponentLink2Description: Datasheet; ComponentLink2URL: http://www.samtec.com/documents/webfiles/pdf/SSM_SM.PDF; ComponentLink3Description: Package Specification; ComponentLink3URL: http://www.samtec.com/documents/webfiles/cpdf/SSM-1XX-XXX-XX-XX-XX-X-XX-XX-MKT.pdf
footprint SMTC-SSM-122-X-DH-LC (C.L. Surface Mount Socket Strip, 2x22 Pins, Horizontal, 2.54 mm Pitch, Female)
pins: 1, 2, 3, 4, 5, 6, 7, 8, 9, 10, 11, 12, 13, 14, 15, 16, 17, 18, 19, 20, 21, 22, 23, 24, 25, 26, 27, 28, 29, 30, 31, 32, 33, 34, 35, 36, 37, 38, 39, 40, 41, 42, 43, 44

## SSM-122-S-DH-LC
designator J?
Tiger Claw(TM) Surface Mount Socket, Horizontal, -55 to 125 degC, 2.54 mm Pitch, 44-Pin, Female, RoHS; Manufacturer: Samtec; PartNumber: SSM-122-S-DH-LC; Pitch: 2.54 mm; DatasheetVersion: F-214; PackageVersion: CR, 9/1998; PackageReference: SSM-122-X-DH-LC; PackageDescription: .100 C.L. Surface Mount Socket Strip; Orientation: Horizontal; RoHS: True; Temperature Range: -55 to 125 degC; Mounting Technology: Surface Mount; ComponentLink1Description: Manufacturer URL; ComponentLink1URL: http://www.samtec.com; ComponentLink2Description: Datasheet; ComponentLink2URL: http://www.samtec.com/documents/webfiles/pdf/SSM_SM.PDF; ComponentLink3Description: Package Specification; ComponentLink3URL: http://www.samtec.com/documents/webfiles/cpdf/SSM-1XX-XXX-XX-XX-XX-X-XX-XX-MKT.pdf
footprint SMTC-SSM-122-X-DH-LC (C.L. Surface Mount Socket Strip, 2x22 Pins, Horizontal, 2.54 mm Pitch, Female)
pins: 1, 2, 3, 4, 5, 6, 7, 8, 9, 10, 11, 12, 13, 14, 15, 16, 17, 18, 19, 20, 21, 22, 23, 24, 25, 26, 27, 28, 29, 30, 31, 32, 33, 34, 35, 36, 37, 38, 39, 40, 41, 42, 43, 44

## SSM-125-F-DV-LC
designator J?
Tiger Claw(TM) Surface Mount Socket, Vertical, -55 to 125 degC, 2.54 mm Pitch, 50-Pin, Female, RoHS; Manufacturer: Samtec; PartNumber: SSM-125-F-DV-LC; Pitch: 2.54 mm; DatasheetVersion: F-214; PackageVersion: AK, 3/2000; PackageReference: SSM-125-X-DV-LC; PackageDescription: .100 C.L. Double Vertical SMT Socket Strip; Orientation: Vertical; RoHS: True; Temperature Range: -55 to 125 degC; Mounting Technology: Surface Mount; ComponentLink1Description: Manufacturer URL; ComponentLink1URL: http://www.samtec.com; ComponentLink2Description: Datasheet; ComponentLink2URL: http://www.samtec.com/documents/webfiles/pdf/SSM_SM.PDF; ComponentLink3Description: Package Specification; ComponentLink3URL: http://www.samtec.com/documents/webfiles/cpdf/SSM-1XX-XXX-DV-XX-XX-X-XX-MKT.pdf
footprint SMTC-SSM-125-X-DV-LC (C.L. Double Vertical SMT Socket Strip, 2x25 Pins, 2.54mm Pitch, Female)
pins: 1, 2, 3, 4, 5, 6, 7, 8, 9, 10, 11, 12, 13, 14, 15, 16, 17, 18, 19, 20, 21, 22, 23, 24, 25, 26, 27, 28, 29, 30, 31, 32, 33, 34, 35, 36, 37, 38, 39, 40, 41, 42, 43, 44, 45, 46, 47, 48, 49, 50

## SSM-125-L-DV-LC
designator J?
Tiger Claw(TM) Surface Mount Socket, Vertical, -55 to 125 degC, 2.54 mm Pitch, 50-Pin, Female, RoHS; Manufacturer: Samtec; PartNumber: SSM-125-L-DV-LC; Pitch: 2.54 mm; DatasheetVersion: F-214; PackageVersion: AK, 3/2000; PackageReference: SSM-125-X-DV-LC; PackageDescription: .100 C.L. Double Vertical SMT Socket Strip; Supplier 1: Newark; Supplier Part Number 1: 46P6123; Orientation: Vertical; RoHS: True; Temperature Range: -55 to 125 degC; Mounting Technology: Surface Mount; ComponentLink1Description: Manufacturer URL; ComponentLink1URL: http://www.samtec.com; ComponentLink2Description: Datasheet; ComponentLink2URL: http://www.samtec.com/documents/webfiles/pdf/SSM_SM.PDF; ComponentLink3Description: Package Specification; ComponentLink3URL: http://www.samtec.com/documents/webfiles/cpdf/SSM-1XX-XXX-DV-XX-XX-X-XX-MKT.pdf
footprint SMTC-SSM-125-X-DV-LC (C.L. Double Vertical SMT Socket Strip, 2x25 Pins, 2.54mm Pitch, Female)
pins: 1, 2, 3, 4, 5, 6, 7, 8, 9, 10, 11, 12, 13, 14, 15, 16, 17, 18, 19, 20, 21, 22, 23, 24, 25, 26, 27, 28, 29, 30, 31, 32, 33, 34, 35, 36, 37, 38, 39, 40, 41, 42, 43, 44, 45, 46, 47, 48, 49, 50

## SSM-125-S-DV-LC
designator J?
Tiger Claw(TM) Surface Mount Socket, Vertical, -55 to 125 degC, 2.54 mm Pitch, 50-Pin, Female, RoHS; Manufacturer: Samtec; PartNumber: SSM-125-S-DV-LC; Pitch: 2.54 mm; DatasheetVersion: F-214; PackageVersion: AK, 3/2000; PackageReference: SSM-125-X-DV-LC; PackageDescription: .100 C.L. Double Vertical SMT Socket Strip; Supplier 1: Newark; Supplier Part Number 1: 81P7046; Orientation: Vertical; RoHS: True; Temperature Range: -55 to 125 degC; Mounting Technology: Surface Mount; ComponentLink1Description: Manufacturer URL; ComponentLink1URL: http://www.samtec.com; ComponentLink2Description: Datasheet; ComponentLink2URL: http://www.samtec.com/documents/webfiles/pdf/SSM_SM.PDF; ComponentLink3Description: Package Specification; ComponentLink3URL: http://www.samtec.com/documents/webfiles/cpdf/SSM-1XX-XXX-DV-XX-XX-X-XX-MKT.pdf
footprint SMTC-SSM-125-X-DV-LC (C.L. Double Vertical SMT Socket Strip, 2x25 Pins, 2.54mm Pitch, Female)
pins: 1, 2, 3, 4, 5, 6, 7, 8, 9, 10, 11, 12, 13, 14, 15, 16, 17, 18, 19, 20, 21, 22, 23, 24, 25, 26, 27, 28, 29, 30, 31, 32, 33, 34, 35, 36, 37, 38, 39, 40, 41, 42, 43, 44, 45, 46, 47, 48, 49, 50

## SSM-127-F-DV-LC
designator J?
Tiger Claw(TM) Surface Mount Socket, Vertical, -55 to 125 degC, 2.54 mm Pitch, 54-Pin, Female, RoHS; Manufacturer: Samtec; PartNumber: SSM-127-F-DV-LC; Pitch: 2.54 mm; DatasheetVersion: F-214; PackageVersion: AK, 3/2000; PackageReference: SSM-127-X-DV-LC; PackageDescription: .100 C.L. Double Vertical SMT Socket Strip; Orientation: Vertical; RoHS: True; Temperature Range: -55 to 125 degC; Mounting Technology: Surface Mount; ComponentLink1Description: Manufacturer URL; ComponentLink1URL: http://www.samtec.com; ComponentLink2Description: Datasheet; ComponentLink2URL: http://www.samtec.com/documents/webfiles/pdf/SSM_SM.PDF; ComponentLink3Description: Package Specification; ComponentLink3URL: http://www.samtec.com/documents/webfiles/cpdf/SSM-1XX-XXX-DV-XX-XX-X-XX-MKT.pdf
footprint SMTC-SSM-127-X-DV-LC (C.L. Double Vertical SMT Socket Strip, 2x27 Pins, 2.54mm Pitch, Female)
pins: 1, 2, 3, 4, 5, 6, 7, 8, 9, 10, 11, 12, 13, 14, 15, 16, 17, 18, 19, 20, 21, 22, 23, 24, 25, 26, 27, 28, 29, 30, 31, 32, 33, 34, 35, 36, 37, 38, 39, 40, 41, 42, 43, 44, 45, 46, 47, 48, 49, 50, 51, 52, 53, 54

## SSM-127-L-DV-LC
designator J?
Tiger Claw(TM) Surface Mount Socket, Vertical, -55 to 125 degC, 2.54 mm Pitch, 54-Pin, Female, RoHS; Manufacturer: Samtec; PartNumber: SSM-127-L-DV-LC; Pitch: 2.54 mm; DatasheetVersion: F-214; PackageVersion: AK, 3/2000; PackageReference: SSM-127-X-DV-LC; PackageDescription: .100 C.L. Double Vertical SMT Socket Strip; Orientation: Vertical; RoHS: True; Temperature Range: -55 to 125 degC; Mounting Technology: Surface Mount; ComponentLink1Description: Manufacturer URL; ComponentLink1URL: http://www.samtec.com; ComponentLink2Description: Datasheet; ComponentLink2URL: http://www.samtec.com/documents/webfiles/pdf/SSM_SM.PDF; ComponentLink3Description: Package Specification; ComponentLink3URL: http://www.samtec.com/documents/webfiles/cpdf/SSM-1XX-XXX-DV-XX-XX-X-XX-MKT.pdf
footprint SMTC-SSM-127-X-DV-LC (C.L. Double Vertical SMT Socket Strip, 2x27 Pins, 2.54mm Pitch, Female)
pins: 1, 2, 3, 4, 5, 6, 7, 8, 9, 10, 11, 12, 13, 14, 15, 16, 17, 18, 19, 20, 21, 22, 23, 24, 25, 26, 27, 28, 29, 30, 31, 32, 33, 34, 35, 36, 37, 38, 39, 40, 41, 42, 43, 44, 45, 46, 47, 48, 49, 50, 51, 52, 53, 54

## SSM-127-S-DV-LC
designator J?
Tiger Claw(TM) Surface Mount Socket, Vertical, -55 to 125 degC, 2.54 mm Pitch, 54-Pin, Female, RoHS; Manufacturer: Samtec; PartNumber: SSM-127-S-DV-LC; Pitch: 2.54 mm; DatasheetVersion: F-214; PackageVersion: AK, 3/2000; PackageReference: SSM-127-X-DV-LC; PackageDescription: .100 C.L. Double Vertical SMT Socket Strip; Orientation: Vertical; RoHS: True; Temperature Range: -55 to 125 degC; Mounting Technology: Surface Mount; ComponentLink1Description: Manufacturer URL; ComponentLink1URL: http://www.samtec.com; ComponentLink2Description: Datasheet; ComponentLink2URL: http://www.samtec.com/documents/webfiles/pdf/SSM_SM.PDF; ComponentLink3Description: Package Specification; ComponentLink3URL: http://www.samtec.com/documents/webfiles/cpdf/SSM-1XX-XXX-DV-XX-XX-X-XX-MKT.pdf
footprint SMTC-SSM-127-X-DV-LC (C.L. Double Vertical SMT Socket Strip, 2x27 Pins, 2.54mm Pitch, Female)
pins: 1, 2, 3, 4, 5, 6, 7, 8, 9, 10, 11, 12, 13, 14, 15, 16, 17, 18, 19, 20, 21, 22, 23, 24, 25, 26, 27, 28, 29, 30, 31, 32, 33, 34, 35, 36, 37, 38, 39, 40, 41, 42, 43, 44, 45, 46, 47, 48, 49, 50, 51, 52, 53, 54